# Altium footprint library RL1.PCBLIB: 94 footprints (part 5 of 6)
Each footprint in its own frame and in the unit in brackets; x right, y up, seen from the top. Pads: shape width x height; smd on the part's side, far side on the other; paste and mask are expansions set on the pad; w line width, h text height; cw(c..) or ccw(c..) is an arc to the next point about the centre after c.
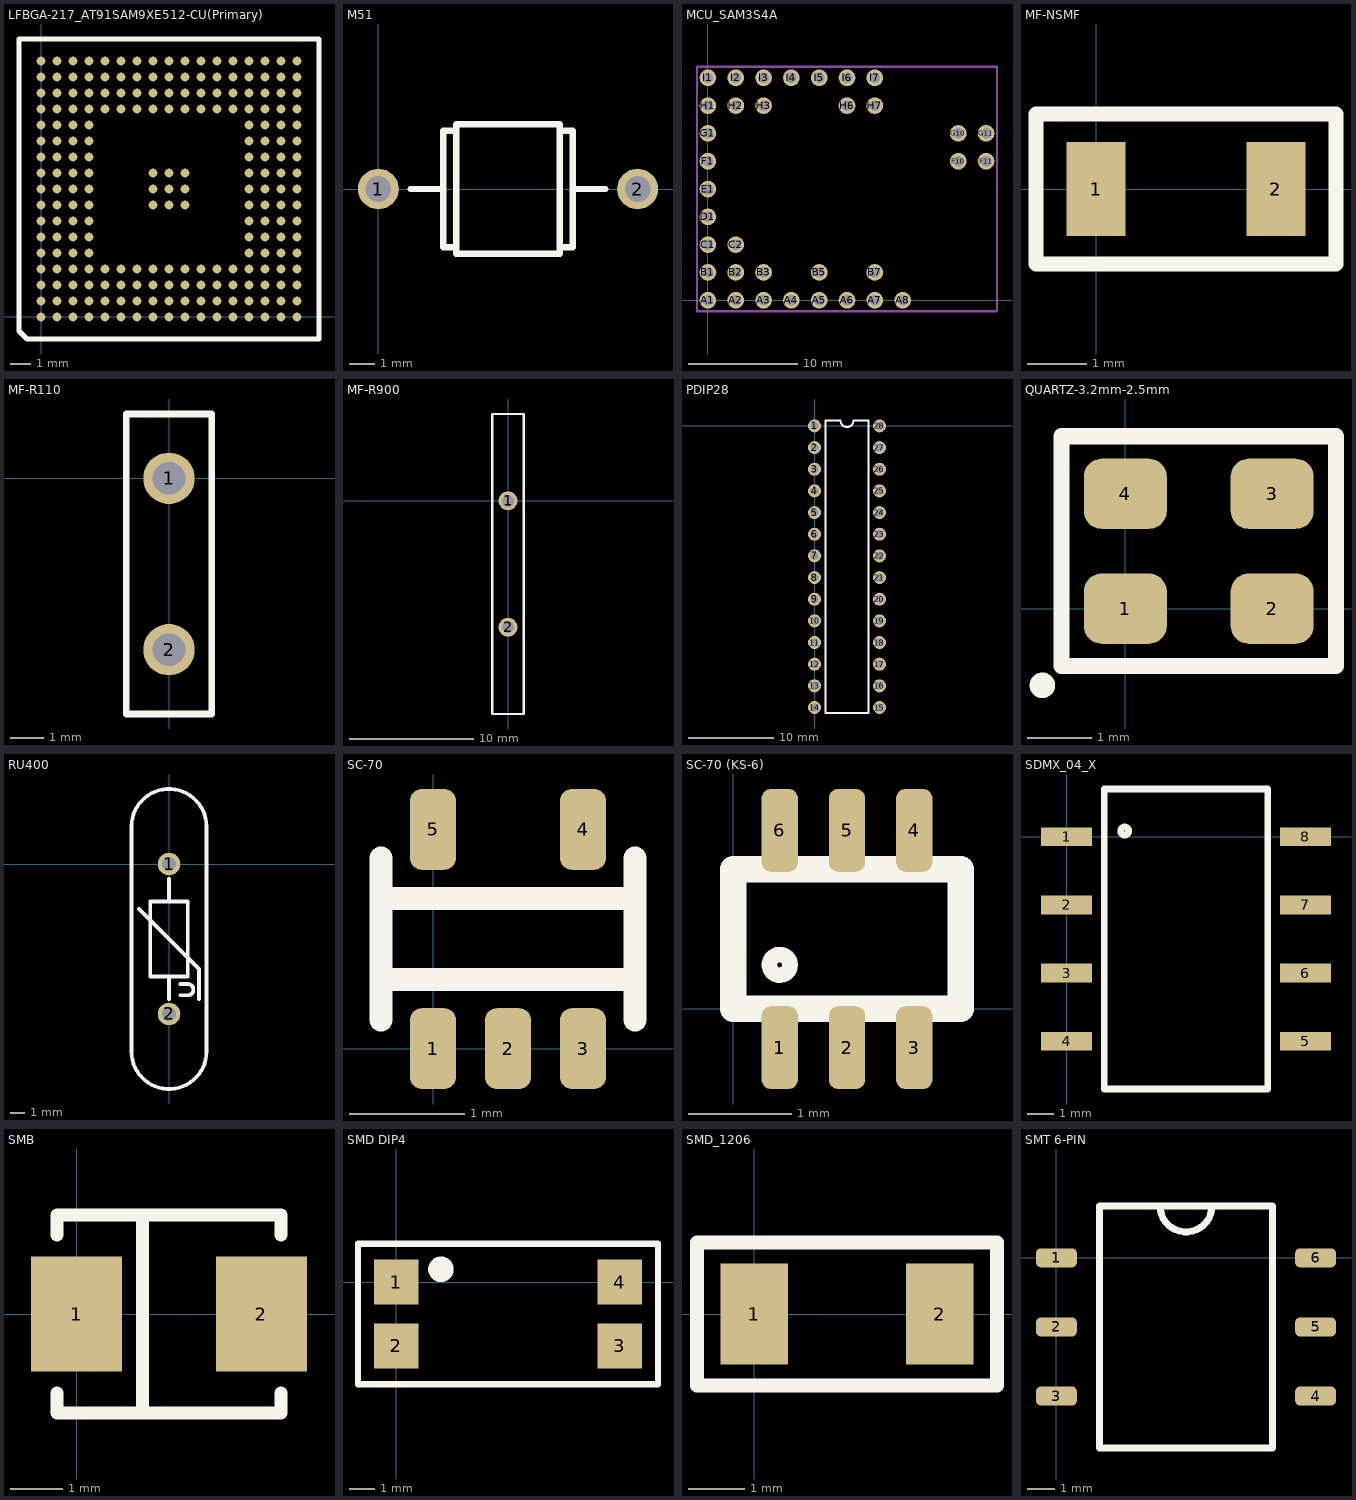
[diagram p4: the footprints below, top view; thin cyan lines are the x and y axes]

## LFBGA-217_AT91SAM9XE512-CU(Primary) [mm]
pads (217):
  round 0.43 smd mask-25.4: A1(0,0) A2(0.8,0) A3(1.6,0) A4(2.4,0) A5(3.2,0) A6(4,0) A7(4.8,0) A8(5.6,0) A9(6.4,0) A10(7.2,0) A11(8,0) A12(8.8,0) A13(9.6,0) A14(10.4,0) A15(11.2,0) A16(12,0) A17(12.8,0) B1(0,0.8) B2(0.8,0.8) B3(1.6,0.8) B4(2.4,0.8) B5(3.2,0.8) B6(4,0.8) B7(4.8,0.8) B8(5.6,0.8) B9(6.4,0.8) B10(7.2,0.8) B11(8,0.8) B12(8.8,0.8) B13(9.6,0.8) B14(10.4,0.8) B15(11.2,0.8) B16(12,0.8) B17(12.8,0.8) C1(0,1.6) C2(0.8,1.6) C3(1.6,1.6) C4(2.4,1.6) C5(3.2,1.6) C6(4,1.6) C7(4.8,1.6) C8(5.6,1.6) C9(6.4,1.6) C10(7.2,1.6) C11(8,1.6) C12(8.8,1.6) C13(9.6,1.6) C14(10.4,1.6) C15(11.2,1.6) C16(12,1.6) C17(12.8,1.6) D1(0,2.4) D2(0.8,2.4) D3(1.6,2.4) D4(2.4,2.4) D5(3.2,2.4) D6(4,2.4) D7(4.8,2.4) D8(5.6,2.4) D9(6.4,2.4) D10(7.2,2.4) D11(8,2.4) D12(8.8,2.4) D13(9.6,2.4) D14(10.4,2.4) D15(11.2,2.4) D16(12,2.4) D17(12.8,2.4) E1(0,3.2) E2(0.8,3.2) E3(1.6,3.2) E4(2.4,3.2) E14(10.4,3.2) E15(11.2,3.2) E16(12,3.2) E17(12.8,3.2) F1(0,4) F2(0.8,4) F3(1.6,4) F4(2.4,4) F14(10.4,4) F15(11.2,4) F16(12,4) F17(12.8,4) G1(0,4.8) G2(0.8,4.8) G3(1.6,4.8) G4(2.4,4.8) G14(10.4,4.8) G15(11.2,4.8) G16(12,4.8) G17(12.8,4.8) H1(0,5.6) H2(0.8,5.6) H3(1.6,5.6) H4(2.4,5.6) H8(5.6,5.6) H9(6.4,5.6) H10(7.2,5.6) H14(10.4,5.6) H15(11.2,5.6) H16(12,5.6) H17(12.8,5.6) J1(0,6.4) J2(0.8,6.4) J3(1.6,6.4) J4(2.4,6.4) J8(5.6,6.4) J9(6.4,6.4) J10(7.2,6.4) J14(10.4,6.4) J15(11.2,6.4) J16(12,6.4) J17(12.8,6.4) K1(0,7.2) K2(0.8,7.2) K3(1.6,7.2) K4(2.4,7.2) K8(5.6,7.2) K9(6.4,7.2) K10(7.2,7.2) K14(10.4,7.2) K15(11.2,7.2) K16(12,7.2) K17(12.8,7.2) L1(0,8) L2(0.8,8) L3(1.6,8) L4(2.4,8) L14(10.4,8) L15(11.2,8) L16(12,8) L17(12.8,8) M1(0,8.8) M2(0.8,8.8) M3(1.6,8.8) M4(2.4,8.8) M14(10.4,8.8) M15(11.2,8.8) M16(12,8.8) M17(12.8,8.8) N1(0,9.6) N2(0.8,9.6) N3(1.6,9.6) N4(2.4,9.6) N14(10.4,9.6) N15(11.2,9.6) N16(12,9.6) N17(12.8,9.6) P1(0,10.4) P2(0.8,10.4) P3(1.6,10.4) P4(2.4,10.4) P5(3.2,10.4) P6(4,10.4) P7(4.8,10.4) P8(5.6,10.4) P9(6.4,10.4) P10(7.2,10.4) P11(8,10.4) P12(8.8,10.4) P13(9.6,10.4) P14(10.4,10.4) P15(11.2,10.4) P16(12,10.4) P17(12.8,10.4) R1(0,11.2) R2(0.8,11.2) R3(1.6,11.2) R4(2.4,11.2) R5(3.2,11.2) R6(4,11.2) R7(4.8,11.2) R8(5.6,11.2) R9(6.4,11.2) R10(7.2,11.2) R11(8,11.2) R12(8.8,11.2) R13(9.6,11.2) R14(10.4,11.2) R15(11.2,11.2) R16(12,11.2) R17(12.8,11.2) T1(0,12) T2(0.8,12) T3(1.6,12) T4(2.4,12) T5(3.2,12) T6(4,12) T7(4.8,12) T8(5.6,12) T9(6.4,12) T10(7.2,12) T11(8,12) T12(8.8,12) T13(9.6,12) T14(10.4,12) T15(11.2,12) T16(12,12) T17(12.8,12) U1(0,12.8) U2(0.8,12.8) U3(1.6,12.8) U4(2.4,12.8) U5(3.2,12.8) U6(4,12.8) U7(4.8,12.8) U8(5.6,12.8) U9(6.4,12.8) U10(7.2,12.8) U11(8,12.8) U12(8.8,12.8) U13(9.6,12.8) U14(10.4,12.8) U15(11.2,12.8) U16(12,12.8) U17(12.8,12.8)
Top Overlay:
  lines w0.254: -1.1,-0.7 -0.7,-1.1 13.9,-1.1 13.9,13.9 -1.1,13.9 -1.1,-0.7
Top Solder:
  drawing of 217 lines, arcs and shapes, not listed
Top Assembly:
  text ".Designator" at 11.398,6.067 h1

## M51 [mm]
pads (2):
  round 1.6 hole 1: 1(0,0) 2(10.16,0)
Top Overlay:
  lines w0.254: 1.27,0 2.54,0 ; 3.048,-2.286 2.54,-2.286 2.54,2.286 3.048,2.286 ; 7.112,-2.286 7.62,-2.286 7.62,2.286 7.112,2.286 ; 7.62,0 8.89,0 ; 3.048,-2.54 3.048,2.54 7.112,2.54 7.112,-2.54 3.048,-2.54
Top Assembly:
  text ".Designator" at 10.078,-0.333 h1

## MCU_SAM3S4A [mil]
pads (35):
  round 60 hole 38: A1(0,0) A2(100,0) A3(200,0) A4(300,0) A5(400,0) A6(500,0) A7(600,0) A8(700,0) B1(0,100) B2(100,100) B3(200,100) B5(400,100) B7(600,100) C1(0,200) C2(100,200) D1(0,300) E1(0,400) F1(0,500) F10(900,500) F11(1000,500) G1(0,600) G10(900,600) G11(1000,600) H1(0,700) H2(100,700) H3(200,700) H6(500,700) H7(600,700) I1(0,800) I2(100,800) I3(200,800) I4(300,800) I5(400,800) I6(500,800) I7(600,800)
Mechanical 1:
  lines w7.87: -39.37,-39.37 1039.37,-39.37 1039.37,839.57 -39.37,839.57 -39.37,-39.37
Top Assembly:
  text ".Designator" at 200.85,380.58 h39.37
3D body "MCU_SAM3S4A.step": height 271.37, standoff 132.49, extent -40.35,-39.37 1038.39,839.37

## MF-NSMF [mm]
pads (2):
  rect 1x1.6 smd: 1(0,0) 2(3.048,0)
Top Overlay:
  lines w0.254: -1.016,-1.27 -1.016,1.27 4.064,1.27 4.064,-1.27 -1.016,-1.27
Top Assembly:
  text ".Designator" at -3.398,-0.333 h1

## MF-R110 [mil]
pads (2):
  round 60 hole 38: 1(0,0) 2(0,-200)
Top Overlay:
  lines w7.87: -50,-275 50,-275 50,75 -50,75 -50,-275
Top Assembly:
  text ".Designator" at 196.79,-113.12 h39.37
3D body "User Library-PTC.STEP": height 590.55, standoff -126.79, extent -45.47,-245.55 45.26,43.18

## MF-R900 [mil]
pads (2):
  round 60 hole 38: 1(0,0) 2(0,-400)
Top Overlay:
  lines w7.87: -50,-675 50,-675 50,275 -50,275 -50,-675
Top Assembly:
  text ".Designator" at 195.49,-213.12 h39.37
3D body "User Library-MF-R700.STEP": height 1185.04, standoff -145.67, extent -130.31,-627.17 127.72,223.31

## PDIP28 [mil]
pads (28):
  round 60 hole 38: 1(0,0) 2(0,-100) 3(0,-200) 4(0,-300) 5(0,-400) 6(0,-500) 7(0,-600) 8(0,-700) 9(0,-800) 10(0,-900) 11(0,-1000) 12(0,-1100) 13(0,-1200) 14(0,-1300) 15(300,-1300) 16(300,-1200) 17(300,-1100) 18(300,-1000) 19(300,-900) 20(300,-800) 21(300,-700) 22(300,-600) 23(300,-500) 24(300,-400) 25(300,-300) 26(300,-200) 27(300,-100) 28(300,0)
Top Overlay:
  lines w10: 50,-1325 250,-1325 250,25 180,25 cw(c150,25) 120,25 50,25 50,-1325
Top Assembly:
  text ".Designator" at 346.79,-663.12 h39.37

## QUARTZ-3.2mm-2.5mm [mm]
pads (4):
  rrect50% 1.3x1.1 smd: 1(0,0) 2(2.3,0) 3(2.3,1.8) 4(0,1.8)
Top Overlay:
  circle w0.2: c-1.3,-1.2 r0.1
  lines w0.254: -1,-0.9 -1,2.7 3.3,2.7 3.3,-0.9 -1,-0.9
Top Assembly:
  text ".Designator" at 5.962,0.38 h1
3D body "GeyerElectronics_KX7.STEP": height 0.81, standoff 0, extent -0.457,-0.335 2.757,2.165

## RU400 [mil]
pads (2):
  round 60 hole 38: 1(0,0) 2(0,-400)
Top Overlay:
  lines w10: -80,-120 80,-280 80,-360 ; 0,-360 0,-300 ; 0,-100 0,-40 ; 30,-350 50,-350 ccw(c50,-335) 50,-320 30,-320 ; -100,-500 ccw(c0,-500) 100,-500 100,100 ccw(c0,100) -100,100 -100,-500 ; -50,-300 50,-300 50,-100 -50,-100 -50,-300
Top Assembly:
  text ".Designator" at 196.79,-213.12 h39.37

## SC-70 [mm]
pads (5):
  rrect50% 0.4x0.7 smd: 1(0,0) 2(0.65,0) 3(1.3,0) 4(1.3,1.9) 5(0,1.9)
Top Overlay:
  lines w0.2: -0.45,0.25 -0.45,1.65 ; -0.45,0.6 1.75,0.6 ; -0.45,1.3 1.75,1.3 ; 1.75,0.25 1.75,1.65
Top Assembly:
  text ".Designator" at 2.102,0.367 h1
3D body "SW3dPS-SOT-323-5L.STEP": height 1, standoff 0, extent -0.4,-0.101 1.7,2.001

## SC-70 (KS-6) [mm]
pads (6):
  rrect50% 0.35x0.8 smd: 1(0.45,-0.375) 2(1.1,-0.375) 3(1.75,-0.375) 4(1.75,1.725) 5(1.1,1.725) 6(0.45,1.725)
Top Overlay:
  circle w0.15: c0.45,0.425 r0.1
  lines w0.254: 0,0 2.2,0 2.2,1.35 0,1.35 0,0
Top Assembly:
  text ".Designator" at 2.602,0.167 h1
3D body "User Library-SC70-6.STEP": height 0.92, standoff -0.03, extent 0.1,-0.375 2.1,1.725

## SDMX_04_X [mm]
pads (8):
  rect 1.9x0.7 smd: 1(0,0) 2(0,-2.54) 3(0,-5.08) 4(0,-7.62) 5(8.89,-7.62) 6(8.89,-5.08) 7(8.89,-2.54) 8(8.89,0)
Top Overlay:
  circle w0.25: c2.159,0.211 r0.15
  lines w0.25: 1.397,-9.398 1.397,1.778 7.493,1.778 7.493,-9.398
  lines w0.254: 1.397,-9.398 7.493,-9.398
Top Assembly:
  text ".Designator" at 9.443,-4.144 h1
3D body "19718.stp": height 4.4, standoff 0, extent -0.44,-9.37 9.36,1.73

## SMB [mm]
pads (2):
  rect 1.75x2.22 smd: 1(0,0) 2(3.556,0)
Top Overlay:
  lines w0.254: -0.381,-1.524 -0.381,-1.905 3.937,-1.905 3.937,-1.524 ; -0.381,1.524 -0.381,1.905 3.937,1.905 3.937,1.524 ; 1.27,-1.905 1.27,1.905
Top Assembly:
  text ".Designator" at 6.776,-0.333 h1

## SMD DIP4 [mm]
pads (4):
  rect 1.78x1.78 smd: 1(0,0) 2(0,-2.54) 3(8.89,-2.54) 4(8.89,0)
Top Overlay:
  circle w0.508: c1.778,0.508 r0.254
  lines w0.254: -1.524,-4.064 10.414,-4.064 10.414,1.524 -1.524,1.524 -1.524,-4.064
Top Assembly:
  text ".Designator" at 9.443,-1.603 h1

## SMD_1206 [mm]
pads (2):
  rect 1.2x1.8 smd: 1(0,0) 2(3.302,0)
Top Overlay:
  lines w0.254: -1.016,-1.27 4.318,-1.27 4.318,1.27 -1.016,1.27 -1.016,-1.27
Top Assembly:
  text ".Designator" at 6.649,-0.333 h1

## SMT 6-PIN [mm]
pads (6):
  rrect50% 1.5x0.7 smd: 1(0,0) 2(0,-2.54) 3(0,-5.08) 4(9.525,-5.08) 5(9.525,-2.54) 6(9.525,0)
Top Overlay:
  lines w0.254: 3.81,1.905 ccw(c4.763,1.905) 5.715,1.905 ; 1.587,-6.985 7.938,-6.985 7.938,1.905 1.587,1.905 1.587,-6.985
Top Assembly:
  text ".Designator" at 9.761,-2.873 h1